# Altium footprint library Revo_connector_kisun.PcbLib: 90 footprints (part 4 of 6)
Each footprint in its own frame and in the unit in brackets; x right, y up, seen from the top. Pads: shape width x height; smd on the part's side, far side on the other; paste and mask are expansions set on the pad; w line width, h text height; cw(c..) or ccw(c..) is an arc to the next point about the centre after c.
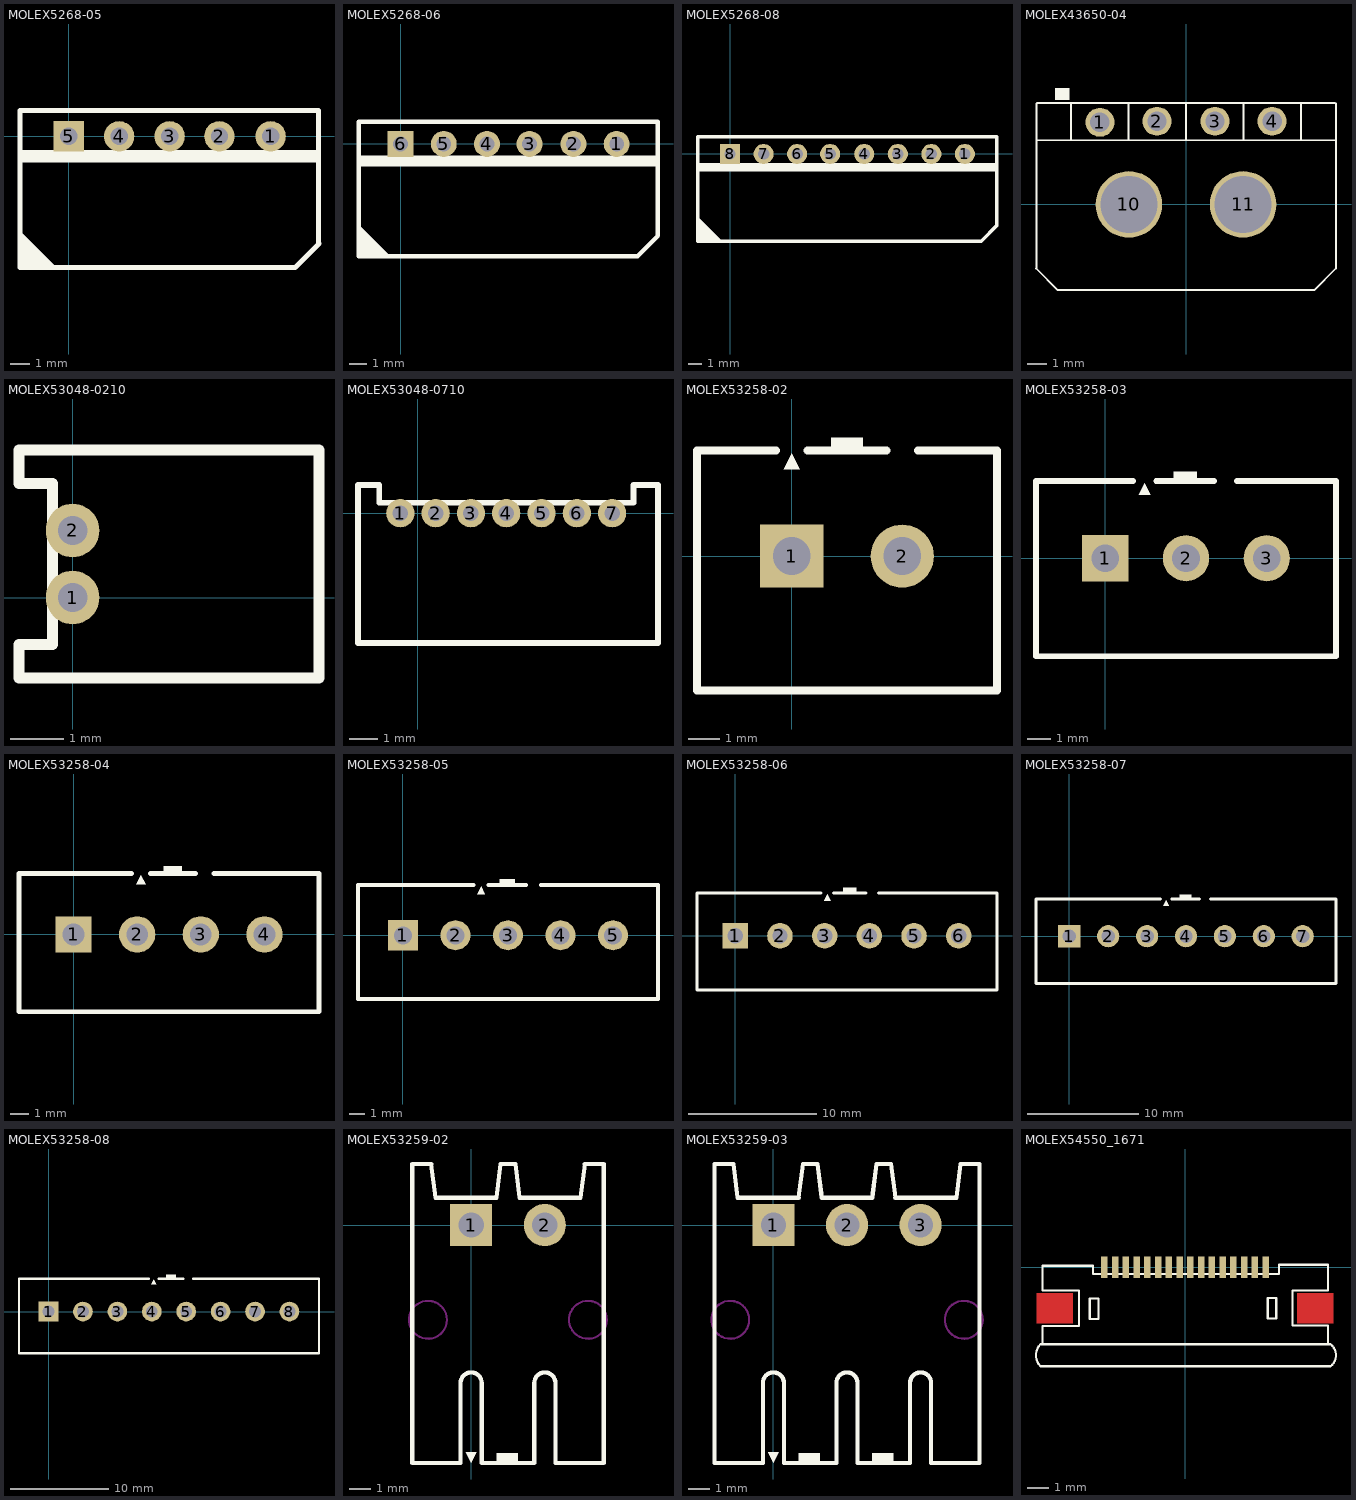
[diagram p3: the footprints below, top view; thin cyan lines are the x and y axes]

## MOLEX5268-05 [mil]
pads (5):
  round 60 hole 34: 1(400,0) 2(298.43,0) 3(200,0) 4(100,0)
  rect 60x60 hole 34: 5(0,0)
Top Overlay:
  region: -94.49,-259.84 -23.62,-259.84 -94.49,-188.98
  region: 201.57,-51.18 492.91,-51.18 492.91,-27.56 201.57,-27.56
  region: -98.43,-51.18 192.91,-51.18 192.91,-27.56 -98.43,-27.56
  region: 101.57,-51.18 392.91,-51.18 392.91,-27.56 101.57,-27.56
  lines w10: -96.46,-259.84 -96.46,51.18 494.88,51.18 494.88,-212.6 ; -94.49,-259.84 448.43,-259.84 495.67,-212.6

## MOLEX5268-06 [mil]
pads (6):
  round 60 hole 34: 1(500,0) 2(400,0) 3(298.43,0) 4(200,0) 5(100,0)
  rect 60x60 hole 34: 6(0,0)
Top Overlay:
  region: 101.57,-51.18 392.91,-51.18 392.91,-27.56 101.57,-27.56
  region: -98.43,-51.18 192.91,-51.18 192.91,-27.56 -98.43,-27.56
  region: 301.57,-51.18 592.91,-51.18 592.91,-27.56 301.57,-27.56
  region: -94.49,-259.84 -23.62,-259.84 -94.49,-188.98
  lines w10: -96.46,-259.84 -96.46,51.18 594.88,51.18 594.88,-212.6 ; -94.49,-259.84 548.43,-259.84 595.67,-212.6

## MOLEX5268-08 [mil]
pads (8):
  round 60 hole 34: 1(700,0) 2(600,0) 3(500,0) 4(400,0) 5(298.43,0) 6(200,0) 7(100,0)
  rect 60x60 hole 34: 8(0,0)
Top Overlay:
  region: -94.49,-259.84 -23.62,-259.84 -94.49,-188.98
  region: 301.57,-51.18 592.91,-51.18 592.91,-27.56 301.57,-27.56
  region: 501.57,-51.18 792.91,-51.18 792.91,-27.56 501.57,-27.56
  region: -98.43,-51.18 192.91,-51.18 192.91,-27.56 -98.43,-27.56
  region: 101.57,-51.18 392.91,-51.18 392.91,-27.56 101.57,-27.56
  lines w10: -96.46,-259.84 -96.46,51.18 794.88,51.18 794.88,-212.6 ; -94.49,-259.84 748.43,-259.84 795.67,-212.6

## MOLEX43650-04 [mm]
pads (6):
  round 1.52 hole 1.02: 1(-4.525,4.32) 2(-1.525,4.375) 3(1.525,4.375) 4(4.525,4.375)
  round 3.5 hole 3: 10(-3,0) 11(3,0)
Top Overlay:
  rectangle: -6.875,5.5 -6.125,6.125
  lines w0.1: -7.887,-3.363 -6.75,-4.5 6.75,-4.5 ; -7.863,-3.375 -7.863,5.318 ; -7.825,5.325 7.825,5.325 ; -7.775,3.375 7.875,3.375 ; -6.05,3.375 -6.05,5.25 ; -3.025,3.375 -3.025,5.25 ; 0,3.45 0,5.325 ; 3.025,3.375 3.025,5.25 ; 6.05,3.375 6.05,5.25 ; 6.125,-4.5 6.75,-4.5 ; 7.887,5.318 7.887,-3.363 6.75,-4.5
3D body "436500400.stp": height 5.64, standoff -3.27, extent -7.825,-4.575 7.825,5.325

## MOLEX53048-0210 [mm]
pads (2):
  round 1 hole 0.55: 1(0,0) 2(0,1.25)
Top Overlay:
  lines w0.203: -1,-1.5 4.597,-1.5 4.597,2.75 -1,2.75 -1,2.125 -0.375,2.125 -0.375,-0.875 -1,-0.875 -1,-1.5
3D body "User Library-molex 53048.step": height 3.55, standoff -2.25, extent -1.05,-1.5 4.45,2.75

## MOLEX53048-0710 [mm] "battery connector"
pads (7):
  round 1 hole 0.55: 1(-0.625,0) 2(0.625,0) 3(1.875,0) 4(3.125,0) 5(4.375,0) 6(5.625,0) 7(6.875,0)
Top Overlay:
  lines w0.203: -2.125,-4.597 -2.125,1 -1.37,1 -1.37,0.375 7.635,0.375 7.635,1 8.5,1 8.5,-4.597 -2.125,-4.597
3D body "530480710.stp": height 3.52, standoff -2.28, extent -2.12,-4.455 8.38,1.045

## MOLEX53258-02 [mm]
pads (2):
  rect 2x2 hole 1.2: 1(0,0)
  round 2 hole 1.2: 2(3.5,0)
Top Overlay:
  region: -0.25,2.75 0.25,2.75 0,3.25
  region: 2.25,3.25 2.25,3.75 1.25,3.75 1.25,3.25
  lines w0.254: -0.5,3.35 -3,3.35 -3,-4.25 6.5,-4.25 6.5,3.35 4,3.35 ; 0.5,3.35 3,3.35

## MOLEX53258-03 [mm]
pads (3):
  rect 2x2 hole 1.2: 1(0,0)
  round 2 hole 1.2: 2(3.5,0) 3(7,0)
Top Overlay:
  region: 3.96,3.25 3.96,3.75 2.96,3.75 2.96,3.25
  region: 1.46,2.75 1.96,2.75 1.71,3.25
  lines w0.254: -1.29,3.35 1.21,3.35 ; -1.25,3.35 -3,3.35 -3,-4.25 10,-4.25 10,3.35 8.25,3.35 ; 2.21,3.35 4.71,3.35 ; 5.71,3.35 8.21,3.35

## MOLEX53258-04 [mm]
pads (4):
  rect 2x2 hole 1.2: 1(0,0)
  round 2 hole 1.2: 2(3.5,0) 3(7,0) 4(10.5,0)
Top Overlay:
  region: 5.96,3.25 5.96,3.75 4.96,3.75 4.96,3.25
  region: 3.46,2.75 3.96,2.75 3.71,3.25
  lines w0.254: -2.5,3.35 -0.75,3.35 ; -1.25,3.35 -3,3.35 -3,-4.25 13.5,-4.25 13.5,3.35 11.75,3.35 ; -1,3.35 0.75,3.35 ; 0.71,3.35 3.21,3.35 ; 4.21,3.35 6.71,3.35 ; 7.71,3.35 10.21,3.35 ; 9.75,3.35 11.5,3.35 ; 10.75,3.35 12.5,3.35

## MOLEX53258-05 [mm]
pads (5):
  rect 2x2 hole 1.2: 1(0,0)
  round 2 hole 1.2: 2(3.5,0) 3(7,0) 4(10.5,0) 5(14,0)
Top Overlay:
  region: 4.96,2.75 5.46,2.75 5.21,3.25
  region: 7.46,3.25 7.46,3.75 6.46,3.75 6.46,3.25
  lines w0.254: -2.5,3.35 -0.75,3.35 ; -1.25,3.35 -3,3.35 -3,-4.25 17,-4.25 17,3.35 15.25,3.35 ; -1,3.35 0.75,3.35 ; 0.71,3.35 3.21,3.35 ; 2.21,3.35 4.71,3.35 ; 5.71,3.35 8.21,3.35 ; 9.21,3.35 11.71,3.35 ; 11.25,3.35 13,3.35 ; 12.75,3.35 14.5,3.35 ; 14.25,3.35 16,3.35

## MOLEX53258-06 [mm]
pads (6):
  rect 2x2 hole 1.2: 1(0,0)
  round 2 hole 1.2: 2(3.5,0) 3(7,0) 4(10.5,0) 5(14,0) 6(17.5,0)
Top Overlay:
  region: 9.46,3.25 9.46,3.75 8.46,3.75 8.46,3.25
  region: 6.96,2.75 7.46,2.75 7.21,3.25
  lines w0.254: -1.5,3.35 0.25,3.35 ; -1.25,3.35 -3,3.35 -3,-4.25 20.5,-4.25 20.5,3.35 18.75,3.35 ; 0,3.35 1.75,3.35 ; 1.71,3.35 4.21,3.35 6.71,3.35 ; 7.71,3.35 10.21,3.35 ; 11.21,3.35 13.71,3.35 ; 13.25,3.35 15,3.35 ; 14.25,3.35 16,3.35 ; 15.75,3.35 17.5,3.35 ; 17.25,3.35 19,3.35

## MOLEX53258-07 [mm]
pads (7):
  rect 2x2 hole 1.2: 1(0,0)
  round 2 hole 1.2: 2(3.5,0) 3(7,0) 4(10.5,0) 5(14,0) 6(17.5,0) 7(21,0)
Top Overlay:
  region: 8.46,2.75 8.96,2.75 8.71,3.25
  region: 10.96,3.25 10.96,3.75 9.96,3.75 9.96,3.25
  lines w0.254: -1.5,3.35 0.25,3.35 ; -1.25,3.35 -3,3.35 -3,-4.25 24,-4.25 24,3.35 22.25,3.35 ; 0,3.35 1.75,3.35 ; 1.71,3.35 4.21,3.35 ; 3.71,3.35 6.21,3.35 ; 5.71,3.35 8.21,3.35 ; 9.21,3.35 11.71,3.35 ; 12.71,3.35 15.21,3.35 ; 14.75,3.35 16.5,3.35 ; 16.25,3.35 18,3.35 ; 17.75,3.35 19.5,3.35 ; 19.25,3.35 21,3.35 ; 20.75,3.35 22.5,3.35

## MOLEX53258-08 [mm]
pads (8):
  rect 2x2 hole 1.2: 1(0,0)
  round 2 hole 1.2: 2(3.5,0) 3(7,0) 4(10.5,0) 5(14,0) 6(17.5,0) 7(21,0) 8(24.5,0)
Top Overlay:
  region: 12.96,3.25 12.96,3.75 11.96,3.75 11.96,3.25
  region: 10.46,2.75 10.96,2.75 10.71,3.25
  lines w0.254: -1.5,3.35 0.25,3.35 ; -1.25,3.35 -3,3.35 -3,-4.25 27.5,-4.25 27.5,3.35 25.75,3.35 ; 0,3.35 1.75,3.35 ; 1.71,3.35 4.21,3.35 ; 3.71,3.35 6.21,3.35 ; 5.71,3.35 8.21,3.35 ; 7.71,3.35 10.21,3.35 ; 11.21,3.35 13.71,3.35 ; 14.71,3.35 17.21,3.35 ; 16.75,3.35 18.5,3.35 ; 18.25,3.35 20,3.35 ; 19.75,3.35 21.5,3.35 ; 21.25,3.35 23,3.35 ; 22.75,3.35 24.5,3.35 ; 24.25,3.35 26,3.35

## MOLEX53259-02 [mm]
pads (2):
  rect 2x2 hole 1.2: 1(0,0)
  round 2 hole 1.2: 2(3.5,0)
Top Overlay:
  region: 2.21,-11.35 2.21,-10.85 1.21,-10.85 1.21,-11.35
  region: 0.25,-10.802 -0.25,-10.802 0,-11.302
  lines w0.2: -2.8,-11.3 -0.5,-11.3 -0.5,-7.5 cw(c0,-7.5) 0.5,-7.5 0.5,-11.3 3,-11.3 3,-7.5 cw(c3.5,-7.5) 4,-7.5 4,-11.3 6.3,-11.3 6.3,2.9 5.4,2.9 5.2,1.3 2.3,1.3 2.1,2.9 1.4,2.9 1.2,1.3 -1.7,1.3 -1.9,2.9 -2.8,2.9 -2.8,-11.3
Keep-Out Layer:
  circle w0.1: c-2.05,-4.5 r0.9
  circle w0.1: c5.55,-4.5 r0.9

## MOLEX53259-03 [mm]
pads (3):
  rect 2x2 hole 1.2: 1(0,0)
  round 2 hole 1.2: 2(3.5,0) 3(6.993,0)
Top Overlay:
  region: 2.21,-11.35 2.21,-10.85 1.21,-10.85 1.21,-11.35
  region: 0.25,-10.802 -0.25,-10.802 0,-11.302
  region: 5.703,-11.35 5.703,-10.85 4.703,-10.85 4.703,-11.35
  lines w0.2: 2.993,-11.3 2.993,-7.5 cw(c3.492,-7.5) 3.992,-7.5 3.992,-11.3 6.492,-11.3 6.492,-7.5 cw(c6.993,-7.5) 7.492,-7.5 7.492,-11.3 9.793,-11.3 9.793,2.9 8.892,2.9 8.692,1.3 5.793,1.3 5.593,2.9 4.892,2.9 4.693,1.3 2.3,1.3 2.1,2.9 1.4,2.9 1.2,1.3 -1.7,1.3 -1.9,2.9 -2.8,2.9 -2.8,-11.3 -0.5,-11.3 -0.5,-7.5 cw(c0,-7.5) 0.5,-7.5 0.5,-11.3 3,-11.3
Keep-Out Layer:
  circle w0.1: c-2.05,-4.5 r0.9
  circle w0.1: c9.042,-4.5 r0.9

## MOLEX54550_1671 [mm] "MOLEX54550_1671"
pads (16):
  rect 0.3x1 smd: 1(-3.75,0) 2(-3.25,0) 3(-2.75,0) 4(-2.25,0) 5(-1.75,0) 6(-1.25,0) 7(-0.75,0) 8(-0.25,0) 9(0.25,0) 10(0.75,0) 11(1.25,0) 12(1.75,0) 13(2.25,0) 14(2.75,0) 15(3.25,0) 16(3.75,0)
Top Layer:
  rectangle: -6.902,-2.601 -5.202,-1.201
  rectangle: 5.198,-2.601 6.898,-1.201
Top Overlay:
  lines w0.1: 6.766,-3.572 -6.722,-3.572 ccw(c-6.175,-4.083) -6.722,-4.595 6.766,-4.596 ccw(c6.368,-4.083) 6.766,-3.571 ; -6.622,-3.572 6.641,-3.572 6.641,-2.697 4.992,-2.697 4.992,-1.074 6.641,-1.074 6.641,0.125 4.368,0.125 4.368,-0.3 -4.274,-0.3 -4.274,0.075 -6.622,0.075 -6.622,-1.074 -4.924,-1.074 -4.924,-2.722 -6.622,-2.722 -6.622,-3.572 ; -4.424,-2.398 -4.024,-2.398 -4.024,-1.449 -4.424,-1.449 -4.424,-2.398 ; 3.843,-2.373 4.243,-2.373 4.243,-1.424 3.843,-1.424 3.843,-2.373
3D body "545501671.stp": height 1.2, standoff 0, extent -6.602,-4.701 6.598,0.299